# Altium footprint library PSU_lib.PcbLib: 108 footprints (part 2 of 7)
Each footprint in its own frame and in the unit in brackets; x right, y up, seen from the top. Pads: shape width x height; smd on the part's side, far side on the other; paste and mask are expansions set on the pad; w line width, h text height; cw(c..) or ccw(c..) is an arc to the next point about the centre after c.
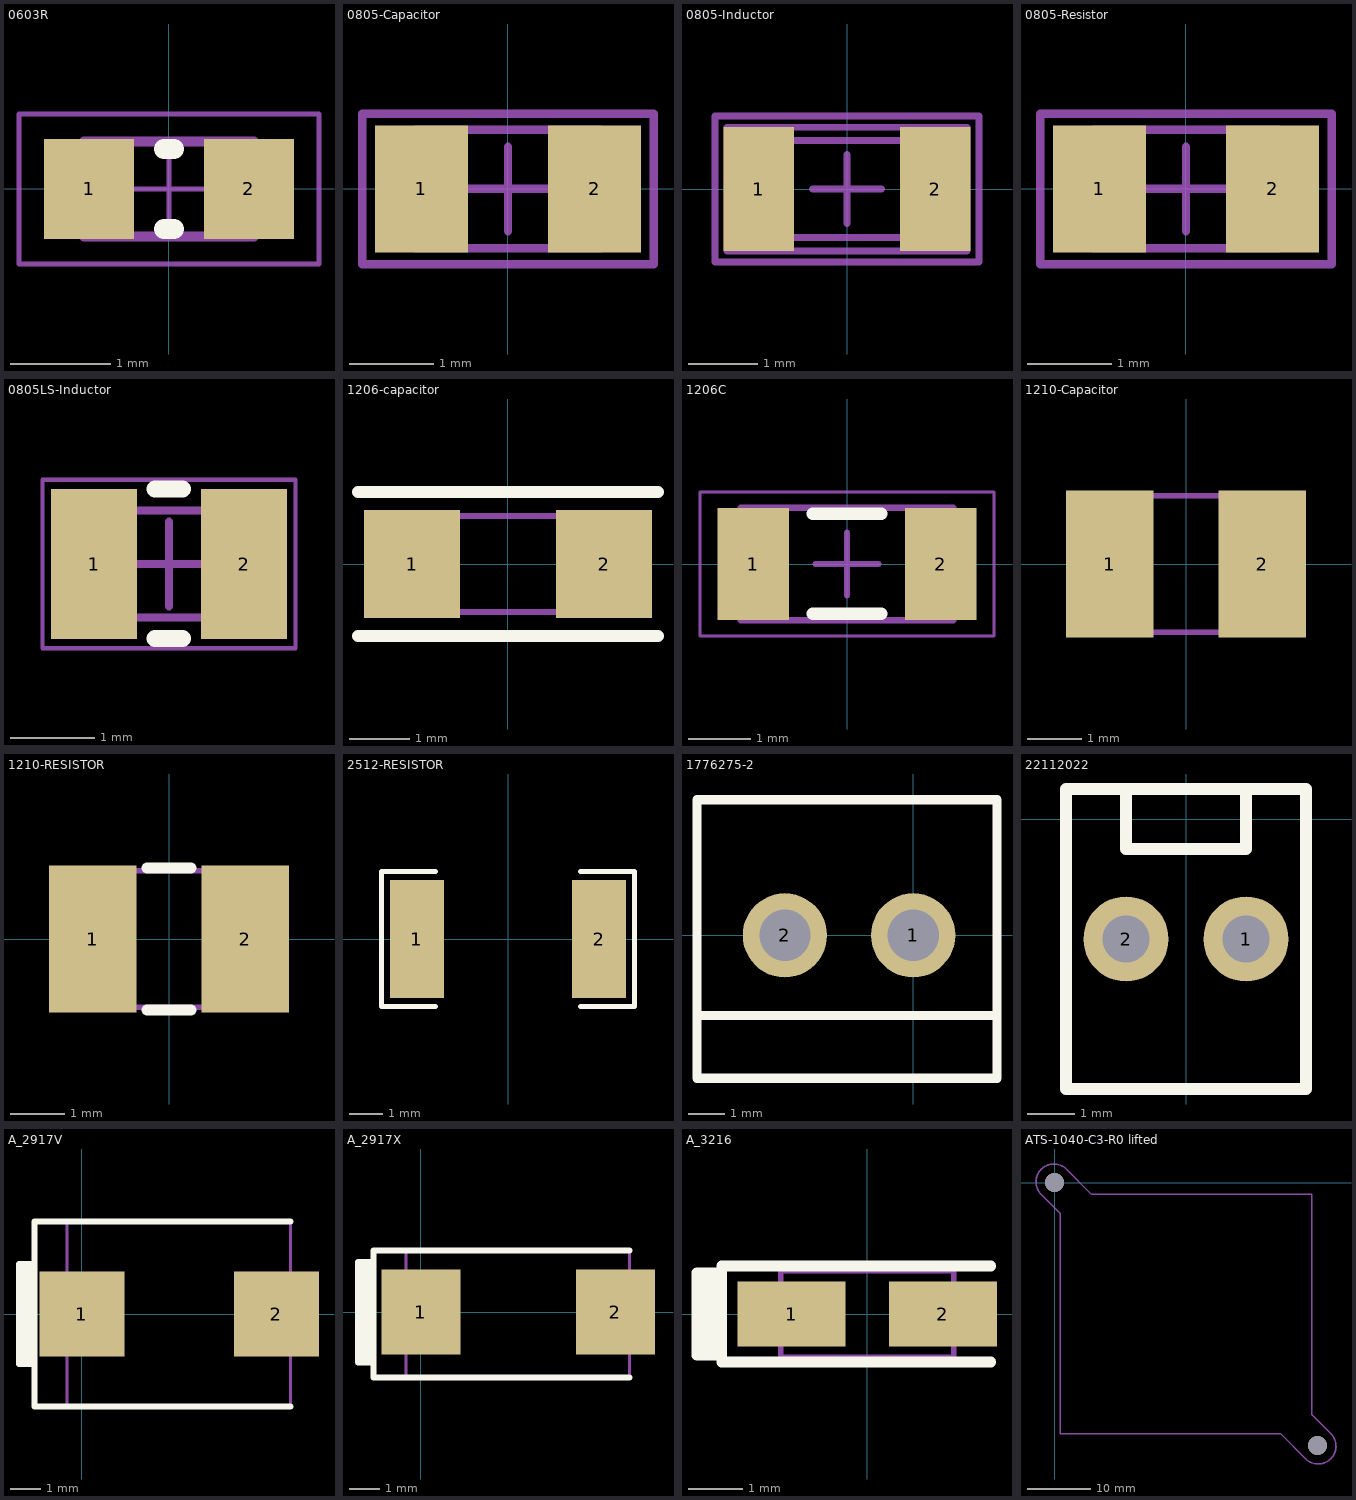
[diagram p1: the footprints below, top view; thin cyan lines are the x and y axes]

## 0603R [mm] "Chip Resistor, Body 1.6x0.8mm, IPC Medium Density"
height 0.6
pads (2):
  rect 0.9x1 smd: 1(-0.8,0) 2(0.8,0)
Top Overlay:
  lines w0.2: -0.05,-0.4 0.05,-0.4 ; -0.05,0.4 0.05,0.4
Mechanical 13:
  lines w0.1: -0.85,-0.475 -0.85,0.475 0.85,0.475 0.85,-0.475 -0.85,-0.475
Mechanical 15:
  lines w0.05: -0.475,0 0.475,0 ; 0,-0.475 0,0.475 ; -1.5,-0.75 -1.5,0.75 1.5,0.75 1.5,-0.75 -1.5,-0.75
3D body: height 0.6, standoff 0, extent 0.581,-0.474 0.85,0.475
3D body: height 0.6, standoff 0, extent -0.58,-0.474 0.581,0.475
3D body: height 0.6, standoff 0, extent -0.849,-0.474 -0.58,0.475

## 0805-Capacitor [mm] "Chip Resistor, 2-Leads, Body 2,1x1,3mm, IPC Medium Density"
height 0.5
pads (2):
  rect 1.1x1.5 smd: 1(-1.025,0) 2(1.025,0)
Mechanical 13:
  lines w0.1: -1.1,-0.7 1.1,-0.7 1.1,0.7 -1.1,0.7 -1.1,-0.7
Mechanical 15:
  lines w0.1: -0.5,0 0.5,0 ; 0,-0.5 0,0.5 ; -1.727,-0.889 -1.727,0.889 1.727,0.889 1.727,-0.889 -1.727,-0.889
Mechanical 16:
  lines w0.1: -1.727,-0.892 -1.727,0.889 ; -1.727,-0.892 1.727,-0.892 ; -1.727,-0.892 -1.727,0.889 ; -1.727,-0.892 1.727,-0.892 ; -1.727,0.889 1.727,0.889 ; -1.727,0.889 1.727,0.889 ; 1.727,-0.892 1.727,0.889 ; 1.727,-0.892 1.727,0.889
Mechanical 30:
  text ".Designator" at -1.975,-0.425 h0.8
Mechanical 31:
  text ".Comment" at -2.025,-0.45 h0.8
3D body "CAP0805.stp": height 0.78, standoff 0, extent -1,-0.625 1,0.625

## 0805-Inductor [mm] "Chip Resistor, 2-Leads, Body 2,1x1,3mm, IPC Medium Density"
height 0.5
pads (2):
  rect 1.02x1.78 smd: 1(-1.27,0) 2(1.27,0)
Mechanical 13:
  lines w0.1: -1.1,-0.7 -1.1,0.7 1.1,0.7 1.1,-0.7 -1.1,-0.7
Mechanical 15:
  lines w0.1: -0.5,0 0.5,0 ; 0,-0.5 0,0.5 ; -1.9,-1.05 1.9,-1.05 1.9,1.05 -1.9,1.05 -1.9,-1.05
Mechanical 30:
  lines w0.1: -1.727,-0.892 1.727,-0.892 1.727,0.889 -1.727,0.889 -1.727,-0.892
  text ".Designator" at -1.975,-0.425 h0.8
Mechanical 31:
  lines w0.1: -1.727,-0.892 1.727,-0.892 1.727,0.889 -1.727,0.889 -1.727,-0.892
  text ".Comment" at -2.025,-0.45 h0.8
3D body "CAP0805.stp": height 0.78, standoff 0, extent -1,-0.625 1,0.625

## 0805-Resistor [mm] "Chip Resistor, 2-Leads, Body 2,1x1,3mm, IPC Medium Density"
height 0.5
pads (2):
  rect 1.1x1.5 smd: 1(-1.025,0) 2(1.025,0)
Mechanical 13:
  lines w0.1: -1.1,-0.7 1.1,-0.7 1.1,0.7 -1.1,0.7 -1.1,-0.7
Mechanical 15:
  lines w0.1: -0.5,0 0.5,0 ; 0,-0.5 0,0.5 ; -1.727,-0.889 -1.727,0.889 1.727,0.889 1.727,-0.889 -1.727,-0.889
Mechanical 16:
  lines w0.1: -1.727,-0.892 -1.727,0.889 ; -1.727,-0.892 1.727,-0.892 ; -1.727,-0.892 -1.727,0.889 ; -1.727,-0.892 1.727,-0.892 ; -1.727,0.889 1.727,0.889 ; -1.727,0.889 1.727,0.889 ; 1.727,-0.892 1.727,0.889 ; 1.727,-0.892 1.727,0.889
Mechanical 30:
  text ".Designator" at -1.975,-0.425 h0.8
Mechanical 31:
  text ".Comment" at -2.025,-0.45 h0.8
3D body "RESC-0805.stp": height 0.6, standoff 0, extent -1.05,-0.675 1.05,0.675

## 0805LS-Inductor [mm]
height 1.6
pads (2):
  rect 1.02x1.78 smd: 1(-4.45,3.56) 2(-2.67,3.56)
Top Overlay:
  lines w0.2: -3.725,2.675 -3.4,2.675 ; -3.725,4.45 -3.4,4.45
Mechanical 13:
  lines w0.1: -4.705,2.925 -2.415,2.925 -2.415,4.195 -4.705,4.195 -4.705,2.925
Mechanical 15:
  lines w0.05: -5.06,2.56 -2.06,2.56 -2.06,4.56 -5.06,4.56 -5.06,2.56
  lines w0.1: -4.06,3.56 -3.06,3.56 ; -3.56,3.06 -3.56,4.06
3D body: height 1.6, standoff 0, extent -2.925,2.925 -2.415,4.195
3D body: height 1.6, standoff 0, extent -4.705,2.925 -4.195,4.195
3D body: height 1.6, standoff 0, extent -4.195,2.925 -2.925,4.195

## 1206-capacitor [mm]
height 0.5
pads (2):
  rect 1.6x1.8 smd: 1(-1.6,0) 2(1.6,0)
Top Overlay:
  lines w0.2: -2.5,-1.2 2.5,-1.2 ; -2.5,1.2 2.5,1.2
Mechanical 13:
  lines w0.1: -1,-0.8 -1,0.8 ; 1,-0.8 1,0.8 ; -1.6,-0.8 1.6,-0.8 1.6,0.8 -1.6,0.8 -1.6,-0.8
3D body: height 1.5, standoff 0.2, extent -1.6,-0.8 1.6,0.8

## 1206C [mm] "Chip Capacitor, Body 3.2x1.6mm, Height 1mm, IPC Medium Density"
height 1
pads (2):
  rect 1.15x1.8 smd: 1(-1.5,0) 2(1.5,0)
Top Overlay:
  lines w0.2: -0.55,-0.8 0.55,-0.8 ; -0.55,0.8 0.55,0.8
Mechanical 13:
  lines w0.1: -1.7,-0.9 1.7,-0.9 1.7,0.9 -1.7,0.9 -1.7,-0.9
Mechanical 15:
  lines w0.05: -2.35,-1.15 2.35,-1.15 2.35,1.15 -2.35,1.15 -2.35,-1.15
  lines w0.1: -0.5,0 0.5,0 ; 0,-0.5 0,0.5
3D body: height 1, standoff 0, extent 1.2,-0.9 1.7,0.9
3D body: height 1, standoff 0, extent -1.7,-0.9 -1.2,0.9
3D body: height 1, standoff 0, extent -1.2,-0.9 1.2,0.9

## 1210-Capacitor [mm]
pads (2):
  rect 1.6x2.7 smd: 1(-1.4,0) 2(1.4,0)
Mechanical 13:
  lines w0.1: -1.8,-1.25 -1.8,1.25 1.8,1.25 1.8,-1.25 -1.8,-1.25
3D body: height 2.3, standoff 0.2, extent -1.8,-1.25 1.8,1.25

## 1210-RESISTOR [mm]
pads (2):
  rect 1.6x2.7 smd: 1(-1.4,0) 2(1.4,0)
Top Overlay:
  lines w0.2: -0.4,-1.3 0.4,-1.3 ; -0.4,1.3 0.4,1.3
Mechanical 13:
  lines w0.1: -1.8,-1.25 -1.8,1.25 1.8,1.25 1.8,-1.25 -1.8,-1.25
3D body "Resistor-1210.step": height 0.6, standoff 0, extent -1.6,-1.25 1.6,1.25

## 2512-RESISTOR [mm] "Chip Resistor, 2-Leads, Body 6,3x3,2mm, IPC Medium Density"
pads (2):
  rect 1.6x3.5 smd: 1(-2.7,0) 2(2.7,0)
Top Overlay:
  lines w0.152: -2.15,-2 -3.75,-2 -3.75,2 -2.15,2 ; 2.15,-2 3.75,-2 3.75,2 2.15,2
3D body "res2512.stp": height 0.55, standoff 0, extent -3.15,-1.55 3.15,1.55

## 1776275-2 [mm] "1776275-2 Screw terminal"
height 10
pads (2):
  round 2.3 hole 1.4: 1(0,0) 2(-3.5,0)
Top Overlay:
  lines w0.254: -5.9,-2.187 2.286,-2.187 ; -5.9,-3.9 2.286,-3.9 2.286,3.7 -5.9,3.7 -5.9,-3.9
3D body "stb02.step": height 8.5, standoff -3.5, extent -5.741,-3.777 2.159,3.523

## 22112022 [mm]
pads (2):
  round 1.8 hole 1: 1(1.27,-2.54) 2(-1.27,-2.54)
Top Overlay:
  lines w0.254: -1.27,0.635 -1.27,-0.635 1.27,-0.635 1.27,0.635 ; -2.54,-5.715 -2.54,0.635 2.54,0.635 2.54,-5.715 -2.54,-5.715
3D body "022112022.stp": height 10.73, standoff -3.49, extent -2.464,-5.791 2.464,0.559

## A_2917V [mm] "Tantalum capacitor case V"
height 5
pads (2):
  rect 2.8x2.8 smd: 1(0,0) 2(6.4,0)
Top Overlay:
  lines w0.2: 6.858,-3.048 -1.564,-3.048 -1.564,3.048 6.858,3.048 ; -1.818,-1.651 -1.945,-1.651 -1.945,1.524 -1.691,1.524 ; -1.818,-1.651 -1.818,1.524 -1.691,1.524 ; -1.818,-1.651 -1.564,-1.651 ; -1.691,1.524 -1.691,-1.651 -1.691,1.524 ; -1.564,-1.651 -2.072,-1.651 -2.072,1.651 -1.564,1.651 -1.564,-1.651
Mechanical 13:
  lines w0.1: -0.5,-3.048 -0.5,3.048 6.858,3.048 6.858,-3.048 -0.5,-3.048
3D body "User Library-CT_V.step": height 3.46, standoff 0.01, extent -0.475,-3.05 6.825,3.05

## A_2917X [mm] "Tantalum capacitor case X"
height 5
pads (2):
  rect 2.6x2.8 smd: 1(0,0) 2(6.4,0)
Top Overlay:
  lines w0.2: 6.858,-2.159 -1.564,-2.159 -1.564,2.032 6.858,2.032 ; -1.818,-1.651 -1.564,-1.651 ; -1.818,-1.651 -1.818,1.524 -1.691,1.524 ; -1.818,-1.651 -1.945,-1.651 -1.945,1.524 -1.691,1.524 ; -1.691,1.524 -1.691,-1.651 -1.691,1.524 ; -1.564,-1.651 -1.564,1.651 -2.072,1.651 -2.072,-1.651 -1.564,-1.651
Mechanical 13:
  lines w0.1: -0.5,-2.159 6.858,-2.159 6.858,2.032 -0.5,2.032 -0.5,-2.159
3D body "User Library-CaseX_7343-43.step": height 4.01, standoff 0.01, extent -0.475,-2.277 6.825,2.023

## A_3216 [mm]
pads (2):
  rect 2x1.2 smd: 1(-1.4,0) 2(1.4,0)
Top Overlay:
  lines w0.2: -2.972,-0.762 -2.972,0.762 ; 2.286,-0.889 -2.159,-0.889 -2.692,-0.889 -2.692,0.889 -1.524,0.889 2.286,0.889 ; -3.15,-0.762 -3.15,0.762 -2.794,0.762 -2.794,-0.762 -3.15,-0.762
Mechanical 13:
  lines w0.1: -1.6,-0.8 1.6,-0.8 1.6,0.8 -1.6,0.8 -1.6,-0.8
3D body "CAP_TANT_3216-18_A_case-1.step": height 1.72, standoff 0.02, extent -1.7,-0.9 1.7,0.9

## ATS-1040-C3-R0 lifted [mm]
via 41.74,-41.74 diameter 3 hole 3
via 0,0 diameter 3 hole 3
Mechanical 1:
  lines w0.254: 5.87,-39.87 35.87,-39.87 ; 35.87,-39.87 0.87,-39.87 0.87,-4.87 -2.13,-1.87 cw(c-0.13,0.13) 1.87,2.13 5.87,-1.87 40.87,-1.87 40.87,-36.87 43.87,-39.87 cw(c41.87,-41.87) 39.87,-43.87 35.87,-39.87
3D body: height 30.2, standoff 5.2, extent 0.87,-23.12 40.87,-22.12
3D body: height 30.2, standoff 5.2, extent 0.87,-39.87 40.87,-38.87
3D body: height 30.2, standoff 5.2, extent 0.87,-26.62 40.87,-25.62
3D body: height 30.2, standoff 5.2, extent 0.87,-30.12 40.87,-29.12
3D body: height 30.2, standoff 5.2, extent 0.87,-33.62 40.87,-32.62
3D body: height 30.2, standoff 5.2, extent 0.871,-37.12 40.871,-36.12
3D body: height 30.2, standoff 5.2, extent 0.871,-5.62 40.871,-4.62
3D body: height 30.2, standoff 5.2, extent 0.87,-9.12 40.87,-8.12
3D body: height 30.2, standoff 5.2, extent 0.87,-12.62 40.87,-11.62
3D body: height 30.2, standoff 5.2, extent 0.87,-16.12 40.87,-15.12
3D body: height 30.2, standoff 5.2, extent 0.87,-2.87 40.87,-1.87
3D body: height 30.2, standoff 5.2, extent 0.87,-19.62 40.87,-18.62
3D body: height 8.2, standoff 5.2, extent 39.042,-44.695 44.698,-39.045
3D body: height 8.2, standoff 5.2, extent 35.87,-43.87 43.87,-36.87
3D body: height 8.2, standoff 5.2, extent -2.13,-4.87 5.87,2.13
3D body: height 8.2, standoff 5.2, extent -2.958,-2.695 2.698,2.955
3D body: height 8.2, standoff 5.2, extent 0.87,-39.87 40.87,-1.87